# Altium footprint library WR-TBL_Pluggable PCB Header_5.00mm.PcbLib: 82 footprints (part 6 of 6)
Each footprint in its own frame and in the unit in brackets; x right, y up, seen from the top. Pads: shape width x height; smd on the part's side, far side on the other; paste and mask are expansions set on the pad; w line width, h text height; cw(c..) or ccw(c..) is an arc to the next point about the centre after c.
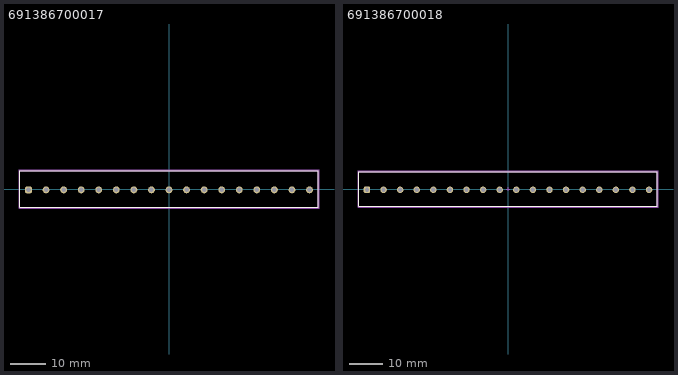
[diagram p5: the footprints below, top view; thin cyan lines are the x and y axes]

## 691386700017 [mm] "5.00mm - PCB Header ( Horizontal / Vertical ), 17p"
height 10.9
pads (17):
  rrect50% 1.95x1.95 hole 1.3: 1(-40,-0.25)
  round 1.95 hole 1.3: 2(-35,-0.25) 3(-30,-0.25) 4(-25,-0.25) 5(-20,-0.25) 6(-15,-0.25) 7(-10,-0.25) 8(-5,-0.25) 9(0,-0.25) 10(5,-0.25) 11(10,-0.25) 12(15,-0.25) 13(20,-0.25) 14(25,-0.25) 15(30,-0.25) 16(35,-0.25) 17(40,-0.25)
Top Overlay:
  lines w0.2: -42.5,-5.25 42.5,-5.25 42.5,5.25 -42.5,5.25 -42.5,-5.25
Top Designator:
  text ".Designator" at -7.498,-0.5 h1.5
Top Component Outline:
  lines w0.1: -42.5,-5.25 -42.5,5.25 42.5,5.25 42.5,-5.25 -42.5,-5.25
Top 3D Body:
  lines w0.1: -42.5,-5.25 42.5,-5.25 42.5,5.25 -42.5,5.25 -42.5,-5.25
Top Courtyard:
  lines w0.05: -42.7,-5.45 -42.7,5.45 42.7,5.45 42.7,-5.45 -42.7,-5.45
Top Component Center:
  lines w0.05: -0.5,0 0.5,0 ; 0,-0.5 0,0.5
3D body "691386700017.stp": height 11, standoff -4, extent -42.5,-5.25 42.5,5.25

## 691386700018 [mm] "5.00mm - PCB Header ( Horizontal / Vertical ), 18p"
height 10.9
pads (18):
  rrect50% 1.95x1.95 hole 1.3: 1(-42.5,-0.25)
  round 1.95 hole 1.3: 2(-37.5,-0.25) 3(-32.5,-0.25) 4(-27.5,-0.25) 5(-22.5,-0.25) 6(-17.5,-0.25) 7(-12.5,-0.25) 8(-7.5,-0.25) 9(-2.5,-0.25) 10(2.5,-0.25) 11(7.5,-0.25) 12(12.5,-0.25) 13(17.5,-0.25) 14(22.5,-0.25) 15(27.5,-0.25) 16(32.5,-0.25) 17(37.5,-0.25) 18(42.5,-0.25)
Top Overlay:
  lines w0.2: -45,-5.25 45,-5.25 45,5.25 -45,5.25 -45,-5.25
Top Designator:
  text ".Designator" at -7.498,-0.5 h1.5
Top Component Outline:
  lines w0.1: -45,-5.25 -45,5.25 45,5.25 45,-5.25 -45,-5.25
Top 3D Body:
  lines w0.1: -45,-5.25 45,-5.25 45,5.25 -45,5.25 -45,-5.25
Top Courtyard:
  lines w0.05: -45.2,-5.45 -45.2,5.45 45.2,5.45 45.2,-5.45 -45.2,-5.45
Top Component Center:
  lines w0.05: -0.5,0 0.5,0 ; 0,-0.5 0,0.5
3D body "691386700018.stp": height 11, standoff -4, extent -45,-5.25 45,5.25